# Altium footprint library DIP Component.PcbLib: 327 footprints (part 21 of 21)
Each footprint in its own frame and in the unit in brackets; x right, y up, seen from the top. Pads: shape width x height; smd on the part's side, far side on the other; paste and mask are expansions set on the pad; w line width, h text height; cw(c..) or ccw(c..) is an arc to the next point about the centre after c.
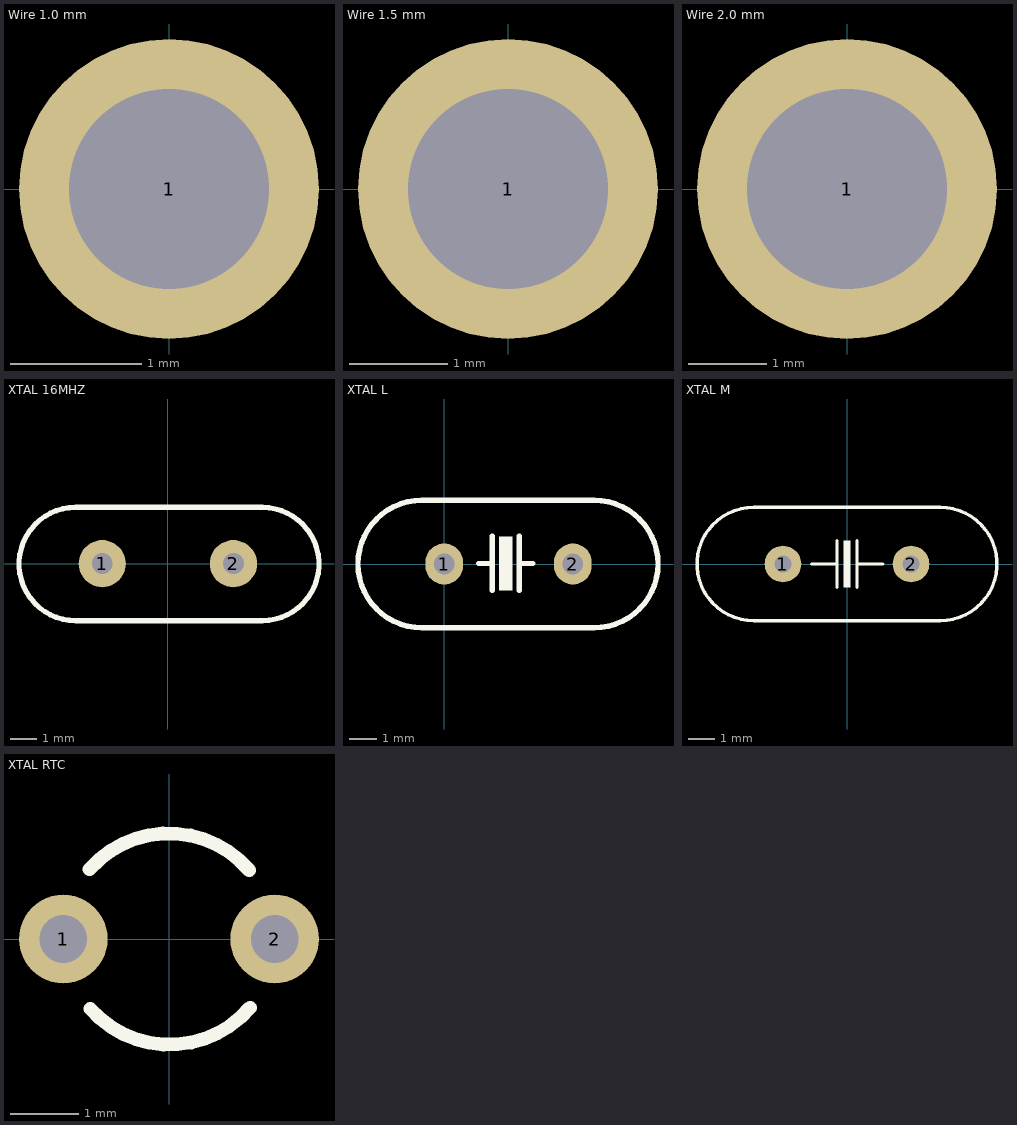
[diagram p20: the footprints below, top view; thin cyan lines are the x and y axes]

## Wire 1.0 mm [mil]
pads (1):
  round 90 hole 60: 1(0,0)
3D body: height 204.72, standoff 7.87, extent -35.15,-35.36 35.44,35.37
3D body: height 118.11, standoff -78.74, extent -19.53,-19.64 19.69,19.65

## Wire 1.5 mm [mil]
pads (1):
  round 120 hole 80: 1(0,0)
3D body: height 118.11, standoff -78.74, extent -29.29,-29.47 29.53,29.47
3D body: height 204.72, standoff 7.87, extent -42.96,-43.22 43.31,43.23

## Wire 2.0 mm [mm]
pads (1):
  round 3.81 hole 2.54: 1(0,0)
3D body: height 5.2, standoff 0.2, extent -1.488,-1.497 1.5,1.497
3D body: height 3, standoff -2, extent -0.992,-0.998 1,0.998

## XTAL 16MHZ [mm] "Crystal Oscillator"
pads (2):
  round 1.8 hole 0.8: 1(-2.5,0) 2(2.5,0)
Top Overlay:
  lines w0.2: -3.512,-2.172 -0.462,-2.172 3.574,-2.172 ; -3.51,-2.175 cw(c-3.51,-0.013) -3.51,2.15 ; -3.487,2.146 -0.462,2.146 ; -0.716,2.146 3.574,2.146 ; 3.602,-2.172 ccw(c3.602,-0.013) 3.602,2.146
3D body "User Library-HC-49_LT_THT_16MHz.STEP": height 0.99, standoff -4.6, extent -5.682,-2.376 5.668,2.274

## XTAL L [mil] "Crystal Oscillator"
height 590.55
pads (2):
  oval 55x60 hole 30: 1(0,0) 2(187.4,0)
Top Overlay:
  rectangle: 79.53,-38.58 99.21,40.16
  lines w7.87: 50,0.79 69.69,0.79 ; 69.69,-38.58 69.69,40.16 ; 109.06,-38.58 109.06,40.16 ; 109.06,0.79 128.74,0.79 ; -32.68,-92.91 cw(c-32.68,0) -32.68,92.91 218.5,92.91 cw(c218.5,0) 218.5,-92.91 -32.68,-92.91
3D body "Part5.STEP": height 514.25, standoff -94.02, extent -130.71,-93.7 316.14,95.28

## XTAL M [mil] "Crystal Oscillator"
pads (2):
  round 55 hole 25: 1(-96.06,0) 2(96.06,0)
Top Overlay:
  rectangle: -5,-35 5,35
  lines w5: -53,0 -15,0 ; -15,-35 -15,35 ; 15,-35 15,35 ; 15,0 54,0 ; -140,-85 cw(c-140,0) -140,85 140,85 cw(c140,0) 140,-85 -140,-85
3D body "Crystal-3.8mm.STEP": height 140.16, standoff -78.74, extent -226.38,-88.58 226.38,88.58

## XTAL RTC [mm] "Crystal Oscillator"
pads (2):
  round 1.3 hole 0.7: 1(-1.55,0) 2(1.55,0)
Top Overlay:
  lines w0.2: -1.165,1.022 cw(c0,0) 1.179,1.006 ; -1.155,-1.022 ccw(c0.01,0) 1.189,-1.006
3D body "Crystal TH.STEP": height 8.98, standoff -1.8, extent -1.725,-1.6 1.725,1.6